# Altium schematic symbol library jlcpcb_2025_04_inductors_extended_0805.schlib: 882 symbols (part 5 of 5)
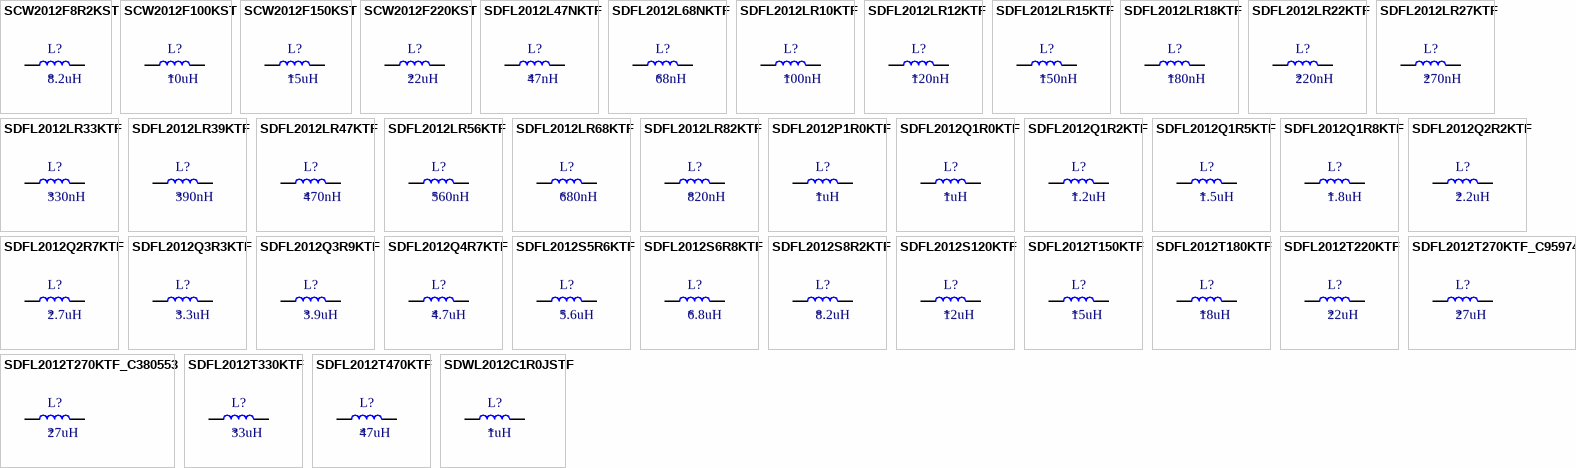
[diagram p26: symbols SCW2012F8R2KST to SDWL2012C1R0JSTF]

## SDFL2012Q2R2KTF
designator L?  Inductance: 2.2uH
Inductor, 2.2uH, ±10%, 650mΩ, 30mA, SMD 0805; Manufacturer: Sunlord; Manufacturer Part Number: SDFL2012Q2R2KTF; Package Size: 0805; JLCPCB Basic Part: No; JLCPCB Part Number: C95973; Supplier 1: LCSC; Category: Inductors; Supplier Part Number 1: C95973; Tolerance: ±10%; Rated Current: 30mA; DC Resistance: 650mΩ; RoHS: Yes; ComponentLink1Description: Datasheet; ComponentLink1URL: https://wmsc.lcsc.com/wmsc/upload/file/pdf/v2/lcsc/2310301641_Sunlord-SDFL2012Q2R2KTF_C95973.pdf; ComponentLink2Description: JLCPCB Part URL; ComponentLink2URL: https://jlcpcb.com/partdetail/C95973; ComponentLink3Description: LCSC Part URL; ComponentLink3URL: https://lcsc.com/product-detail/Inductors-SMD_Sunlord-Sunlord-SDFL2012Q2R2KTF_C95973.html
footprint IND-0805 (0805 (2012M) Inductor)
pins: 1, 2

## SDFL2012Q2R7KTF
designator L?  Inductance: 2.7uH
Inductor, 2.7uH, ±10%, 750mΩ, 30mA, SMD 0805; Manufacturer: Sunlord; Manufacturer Part Number: SDFL2012Q2R7KTF; Package Size: 0805; JLCPCB Basic Part: No; JLCPCB Part Number: C74318; Supplier 1: LCSC; Category: Inductors; Supplier Part Number 1: C74318; Tolerance: ±10%; Rated Current: 30mA; DC Resistance: 750mΩ; RoHS: Yes; ComponentLink1Description: Datasheet; ComponentLink1URL: https://wmsc.lcsc.com/wmsc/upload/file/pdf/v2/lcsc/2310301641_Sunlord-SDFL2012Q2R7KTF_C74318.pdf; ComponentLink2Description: JLCPCB Part URL; ComponentLink2URL: https://jlcpcb.com/partdetail/C74318; ComponentLink3Description: LCSC Part URL; ComponentLink3URL: https://lcsc.com/product-detail/Inductors-SMD_Sunlord-Sunlord-SDFL2012Q2R7KTF_C74318.html
footprint IND-0805 (0805 (2012M) Inductor)
pins: 1, 2

## SDFL2012Q3R3KTF
designator L?  Inductance: 3.3uH
Inductor, 3.3uH, ±10%, 800mΩ, 30mA, SMD 0805; Manufacturer: Sunlord; Manufacturer Part Number: SDFL2012Q3R3KTF; Package Size: 0805; JLCPCB Basic Part: No; JLCPCB Part Number: C51725; Supplier 1: LCSC; Category: Inductors; Supplier Part Number 1: C51725; Tolerance: ±10%; Rated Current: 30mA; DC Resistance: 800mΩ; RoHS: Yes; ComponentLink1Description: Datasheet; ComponentLink1URL: https://wmsc.lcsc.com/wmsc/upload/file/pdf/v2/lcsc/2310301641_Sunlord-SDFL2012Q3R3KTF_C51725.pdf; ComponentLink2Description: JLCPCB Part URL; ComponentLink2URL: https://jlcpcb.com/partdetail/C51725; ComponentLink3Description: LCSC Part URL; ComponentLink3URL: https://lcsc.com/product-detail/Inductors-SMD_Sunlord-Sunlord-SDFL2012Q3R3KTF_C51725.html
footprint IND-0805 (0805 (2012M) Inductor)
pins: 1, 2

## SDFL2012Q3R9KTF
designator L?  Inductance: 3.9uH
Inductor, 3.9uH, ±10%, 900mΩ, 30mA, SMD 0805; Manufacturer: Sunlord; Manufacturer Part Number: SDFL2012Q3R9KTF; Package Size: 0805; JLCPCB Basic Part: No; JLCPCB Part Number: C370274; Supplier 1: LCSC; Category: Inductors; Supplier Part Number 1: C370274; Tolerance: ±10%; Rated Current: 30mA; DC Resistance: 900mΩ; RoHS: Yes; ComponentLink1Description: Datasheet; ComponentLink1URL: https://wmsc.lcsc.com/wmsc/upload/file/pdf/v2/lcsc/2310301641_Sunlord-SDFL2012Q3R9KTF_C370274.pdf; ComponentLink2Description: JLCPCB Part URL; ComponentLink2URL: https://jlcpcb.com/partdetail/C370274; ComponentLink3Description: LCSC Part URL; ComponentLink3URL: https://lcsc.com/product-detail/Inductors-SMD_Sunlord-Sunlord-SDFL2012Q3R9KTF_C370274.html
footprint IND-0805 (0805 (2012M) Inductor)
pins: 1, 2

## SDFL2012Q4R7KTF
designator L?  Inductance: 4.7uH
Inductor, 4.7uH, ±10%, 1Ω, 30mA, SMD 0805; Manufacturer: Sunlord; Manufacturer Part Number: SDFL2012Q4R7KTF; Package Size: 0805; JLCPCB Basic Part: No; JLCPCB Part Number: C74314; Supplier 1: LCSC; Category: Inductors; Supplier Part Number 1: C74314; Tolerance: ±10%; Rated Current: 30mA; DC Resistance: 1Ω; RoHS: Yes; ComponentLink1Description: Datasheet; ComponentLink1URL: https://wmsc.lcsc.com/wmsc/upload/file/pdf/v2/lcsc/2310301641_Sunlord-SDFL2012Q4R7KTF_C74314.pdf; ComponentLink2Description: JLCPCB Part URL; ComponentLink2URL: https://jlcpcb.com/partdetail/C74314; ComponentLink3Description: LCSC Part URL; ComponentLink3URL: https://lcsc.com/product-detail/Inductors-SMD_Sunlord-Sunlord-SDFL2012Q4R7KTF_C74314.html
footprint IND-0805 (0805 (2012M) Inductor)
pins: 1, 2

## SDFL2012S5R6KTF
designator L?  Inductance: 5.6uH
Inductor, 5.6uH, ±10%, 900mΩ, 15mA, SMD 0805; Manufacturer: Sunlord; Manufacturer Part Number: SDFL2012S5R6KTF; Package Size: 0805; JLCPCB Basic Part: No; JLCPCB Part Number: C185875; Supplier 1: LCSC; Category: Inductors; Supplier Part Number 1: C185875; Tolerance: ±10%; Rated Current: 15mA; DC Resistance: 900mΩ; RoHS: Yes; ComponentLink1Description: Datasheet; ComponentLink1URL: https://wmsc.lcsc.com/wmsc/upload/file/pdf/v2/lcsc/2310301641_Sunlord-SDFL2012S5R6KTF_C185875.pdf; ComponentLink2Description: JLCPCB Part URL; ComponentLink2URL: https://jlcpcb.com/partdetail/C185875; ComponentLink3Description: LCSC Part URL; ComponentLink3URL: https://lcsc.com/product-detail/Inductors-SMD_Sunlord-Sunlord-SDFL2012S5R6KTF_C185875.html
footprint IND-0805 (0805 (2012M) Inductor)
pins: 1, 2

## SDFL2012S6R8KTF
designator L?  Inductance: 6.8uH
Inductor, 6.8uH, ±10%, 1Ω, 15mA, SMD 0805; Manufacturer: Sunlord; Manufacturer Part Number: SDFL2012S6R8KTF; Package Size: 0805; JLCPCB Basic Part: No; JLCPCB Part Number: C334249; Supplier 1: LCSC; Category: Inductors; Supplier Part Number 1: C334249; Tolerance: ±10%; Rated Current: 15mA; DC Resistance: 1Ω; RoHS: Yes; ComponentLink1Description: Datasheet; ComponentLink1URL: https://wmsc.lcsc.com/wmsc/upload/file/pdf/v2/lcsc/2310301641_Sunlord-SDFL2012S6R8KTF_C334249.pdf; ComponentLink2Description: JLCPCB Part URL; ComponentLink2URL: https://jlcpcb.com/partdetail/C334249; ComponentLink3Description: LCSC Part URL; ComponentLink3URL: https://lcsc.com/product-detail/Inductors-SMD_Sunlord-Sunlord-SDFL2012S6R8KTF_C334249.html
footprint IND-0805 (0805 (2012M) Inductor)
pins: 1, 2

## SDFL2012S8R2KTF
designator L?  Inductance: 8.2uH
Inductor, 8.2uH, ±10%, 1.1Ω, 15mA, SMD 0805; Manufacturer: Sunlord; Manufacturer Part Number: SDFL2012S8R2KTF; Package Size: 0805; JLCPCB Basic Part: No; JLCPCB Part Number: C334248; Supplier 1: LCSC; Category: Inductors; Supplier Part Number 1: C334248; Tolerance: ±10%; Rated Current: 15mA; DC Resistance: 1.1Ω; RoHS: Yes; ComponentLink1Description: Datasheet; ComponentLink1URL: https://wmsc.lcsc.com/wmsc/upload/file/pdf/v2/lcsc/2310301641_Sunlord-SDFL2012S8R2KTF_C334248.pdf; ComponentLink2Description: JLCPCB Part URL; ComponentLink2URL: https://jlcpcb.com/partdetail/C334248; ComponentLink3Description: LCSC Part URL; ComponentLink3URL: https://lcsc.com/product-detail/Inductors-SMD_Sunlord-Sunlord-SDFL2012S8R2KTF_C334248.html
footprint IND-0805 (0805 (2012M) Inductor)
pins: 1, 2

## SDFL2012S120KTF
designator L?  Inductance: 12uH
Inductor, 12uH, ±10%, 1.25Ω, 15mA, SMD 0805; Manufacturer: Sunlord; Manufacturer Part Number: SDFL2012S120KTF; Package Size: 0805; JLCPCB Basic Part: No; JLCPCB Part Number: C370275; Supplier 1: LCSC; Category: Inductors; Supplier Part Number 1: C370275; Tolerance: ±10%; Rated Current: 15mA; DC Resistance: 1.25Ω; RoHS: Yes; ComponentLink1Description: Datasheet; ComponentLink1URL: https://wmsc.lcsc.com/wmsc/upload/file/pdf/v2/lcsc/2310301641_Sunlord-SDFL2012S120KTF_C370275.pdf; ComponentLink2Description: JLCPCB Part URL; ComponentLink2URL: https://jlcpcb.com/partdetail/C370275; ComponentLink3Description: LCSC Part URL; ComponentLink3URL: https://lcsc.com/product-detail/Inductors-SMD_Sunlord-Sunlord-SDFL2012S120KTF_C370275.html
footprint IND-0805 (0805 (2012M) Inductor)
pins: 1, 2

## SDFL2012T150KTF
designator L?  Inductance: 15uH
Inductor, 15uH, ±10%, 800mΩ, 5mA, SMD 0805; Manufacturer: Sunlord; Manufacturer Part Number: SDFL2012T150KTF; Package Size: 0805; JLCPCB Basic Part: No; JLCPCB Part Number: C154120; Supplier 1: LCSC; Category: Inductors; Supplier Part Number 1: C154120; Tolerance: ±10%; Rated Current: 5mA; DC Resistance: 800mΩ; RoHS: Yes; ComponentLink1Description: Datasheet; ComponentLink1URL: https://wmsc.lcsc.com/wmsc/upload/file/pdf/v2/lcsc/2310301641_Sunlord-SDFL2012T150KTF_C154120.pdf; ComponentLink2Description: JLCPCB Part URL; ComponentLink2URL: https://jlcpcb.com/partdetail/C154120; ComponentLink3Description: LCSC Part URL; ComponentLink3URL: https://lcsc.com/product-detail/Inductors-SMD_Sunlord-Sunlord-SDFL2012T150KTF_C154120.html
footprint IND-0805 (0805 (2012M) Inductor)
pins: 1, 2

## SDFL2012T180KTF
designator L?  Inductance: 18uH
Inductor, 18uH, ±10%, 900mΩ, 5mA, SMD 0805; Manufacturer: Sunlord; Manufacturer Part Number: SDFL2012T180KTF; Package Size: 0805; JLCPCB Basic Part: No; JLCPCB Part Number: C185900; Supplier 1: LCSC; Category: Inductors; Supplier Part Number 1: C185900; Tolerance: ±10%; Rated Current: 5mA; DC Resistance: 900mΩ; RoHS: Yes; ComponentLink1Description: Datasheet; ComponentLink1URL: https://wmsc.lcsc.com/wmsc/upload/file/pdf/v2/lcsc/2310301641_Sunlord-SDFL2012T180KTF_C185900.pdf; ComponentLink2Description: JLCPCB Part URL; ComponentLink2URL: https://jlcpcb.com/partdetail/C185900; ComponentLink3Description: LCSC Part URL; ComponentLink3URL: https://lcsc.com/product-detail/Inductors-SMD_Sunlord-Sunlord-SDFL2012T180KTF_C185900.html
footprint IND-0805 (0805 (2012M) Inductor)
pins: 1, 2

## SDFL2012T220KTF
designator L?  Inductance: 22uH
Inductor, 22uH, ±10%, 1.1Ω, 5mA, SMD 0805; Manufacturer: Sunlord; Manufacturer Part Number: SDFL2012T220KTF; Package Size: 0805; JLCPCB Basic Part: No; JLCPCB Part Number: C32375; Supplier 1: LCSC; Category: Inductors; Supplier Part Number 1: C32375; Tolerance: ±10%; Rated Current: 5mA; DC Resistance: 1.1Ω; RoHS: Yes; ComponentLink1Description: Datasheet; ComponentLink1URL: https://wmsc.lcsc.com/wmsc/upload/file/pdf/v2/lcsc/2310301641_Sunlord-SDFL2012T220KTF_C32375.pdf; ComponentLink2Description: JLCPCB Part URL; ComponentLink2URL: https://jlcpcb.com/partdetail/C32375; ComponentLink3Description: LCSC Part URL; ComponentLink3URL: https://lcsc.com/product-detail/Inductors-SMD_Sunlord-Sunlord-SDFL2012T220KTF_C32375.html
footprint IND-0805 (0805 (2012M) Inductor)
pins: 1, 2

## SDFL2012T270KTF_C95974
designator L?  Inductance: 27uH
Inductor, 27uH, ±10%, 1.15Ω, 5mA, SMD 0805; Manufacturer: Sunlord; Manufacturer Part Number: SDFL2012T270KTF; Package Size: 0805; JLCPCB Basic Part: No; JLCPCB Part Number: C95974; Supplier 1: LCSC; Category: Inductors; Supplier Part Number 1: C95974; Tolerance: ±10%; Rated Current: 5mA; DC Resistance: 1.15Ω; RoHS: Yes; ComponentLink1Description: Datasheet; ComponentLink1URL: https://wmsc.lcsc.com/wmsc/upload/file/pdf/v2/lcsc/2310301641_Sunlord-SDFL2012T270KTF_C95974.pdf; ComponentLink2Description: JLCPCB Part URL; ComponentLink2URL: https://jlcpcb.com/partdetail/C95974; ComponentLink3Description: LCSC Part URL; ComponentLink3URL: https://lcsc.com/product-detail/Inductors-SMD_Sunlord-Sunlord-SDFL2012T270KTF_C95974.html
footprint IND-0805 (0805 (2012M) Inductor)
pins: 1, 2

## SDFL2012T270KTF_C380553
designator L?  Inductance: 27uH
Inductor, 27uH, ±10%, 1.15Ω, 5mA, SMD 0805; Manufacturer: Sunlord; Manufacturer Part Number: SDFL2012T270KTF; Package Size: 0805; JLCPCB Basic Part: No; JLCPCB Part Number: C380553; Supplier 1: LCSC; Category: Inductors; Supplier Part Number 1: C380553; Tolerance: ±10%; Rated Current: 5mA; DC Resistance: 1.15Ω; RoHS: Yes; ComponentLink1Description: Datasheet; ComponentLink1URL: https://wmsc.lcsc.com/wmsc/upload/file/pdf/v2/lcsc/2310301641_Sunlord-SDFL2012T270KTF_C380553.pdf; ComponentLink2Description: JLCPCB Part URL; ComponentLink2URL: https://jlcpcb.com/partdetail/C380553; ComponentLink3Description: LCSC Part URL; ComponentLink3URL: https://lcsc.com/product-detail/Inductors-SMD_Sunlord-Sunlord-SDFL2012T270KTF_C380553.html
footprint IND-0805 (0805 (2012M) Inductor)
pins: 1, 2

## SDFL2012T330KTF
designator L?  Inductance: 33uH
Inductor, 33uH, ±10%, 1.25Ω, 5mA, SMD 0805; Manufacturer: Sunlord; Manufacturer Part Number: SDFL2012T330KTF; Package Size: 0805; JLCPCB Basic Part: No; JLCPCB Part Number: C95975; Supplier 1: LCSC; Category: Inductors; Supplier Part Number 1: C95975; Tolerance: ±10%; Rated Current: 5mA; DC Resistance: 1.25Ω; RoHS: Yes; ComponentLink1Description: Datasheet; ComponentLink1URL: https://wmsc.lcsc.com/wmsc/upload/file/pdf/v2/lcsc/2310301641_Sunlord-SDFL2012T330KTF_C95975.pdf; ComponentLink2Description: JLCPCB Part URL; ComponentLink2URL: https://jlcpcb.com/partdetail/C95975; ComponentLink3Description: LCSC Part URL; ComponentLink3URL: https://lcsc.com/product-detail/Inductors-SMD_Sunlord-Sunlord-SDFL2012T330KTF_C95975.html
footprint IND-0805 (0805 (2012M) Inductor)
pins: 1, 2

## SDFL2012T470KTF
designator L?  Inductance: 47uH
Inductor, 47uH, ±10%, 3Ω, 4mA, SMD 0805; Manufacturer: Sunlord; Manufacturer Part Number: SDFL2012T470KTF; Package Size: 0805; JLCPCB Basic Part: No; JLCPCB Part Number: C14304; Supplier 1: LCSC; Category: Inductors; Supplier Part Number 1: C14304; Tolerance: ±10%; Rated Current: 4mA; DC Resistance: 3Ω; RoHS: Yes; ComponentLink1Description: Datasheet; ComponentLink1URL: https://wmsc.lcsc.com/wmsc/upload/file/pdf/v2/lcsc/2310301641_Sunlord-SDFL2012T470KTF_C14304.pdf; ComponentLink2Description: JLCPCB Part URL; ComponentLink2URL: https://jlcpcb.com/partdetail/C14304; ComponentLink3Description: LCSC Part URL; ComponentLink3URL: https://lcsc.com/product-detail/Inductors-SMD_Sunlord-Sunlord-SDFL2012T470KTF_C14304.html
footprint IND-0805 (0805 (2012M) Inductor)
pins: 1, 2

## SDWL2012C1R0JSTF
designator L?  Inductance: 1uH
Inductor, 1uH, ±5%, 2.5Ω, 150mA, SMD 0805; Manufacturer: Sunlord; Manufacturer Part Number: SDWL2012C1R0JSTF; Package Size: 0805; JLCPCB Basic Part: No; JLCPCB Part Number: C145058; Supplier 1: LCSC; Category: Inductors; Supplier Part Number 1: C145058; Tolerance: ±5%; Rated Current: 150mA; DC Resistance: 2.5Ω; RoHS: Yes; ComponentLink1Description: Datasheet; ComponentLink1URL: https://wmsc.lcsc.com/wmsc/upload/file/pdf/v2/lcsc/2310301641_Sunlord-SDWL2012C1R0JSTF_C145058.pdf; ComponentLink2Description: JLCPCB Part URL; ComponentLink2URL: https://jlcpcb.com/partdetail/C145058; ComponentLink3Description: LCSC Part URL; ComponentLink3URL: https://lcsc.com/product-detail/Inductors-SMD_Sunlord-Sunlord-SDWL2012C1R0JSTF_C145058.html
footprint IND-0805 (0805 (2012M) Inductor)
pins: 1, 2

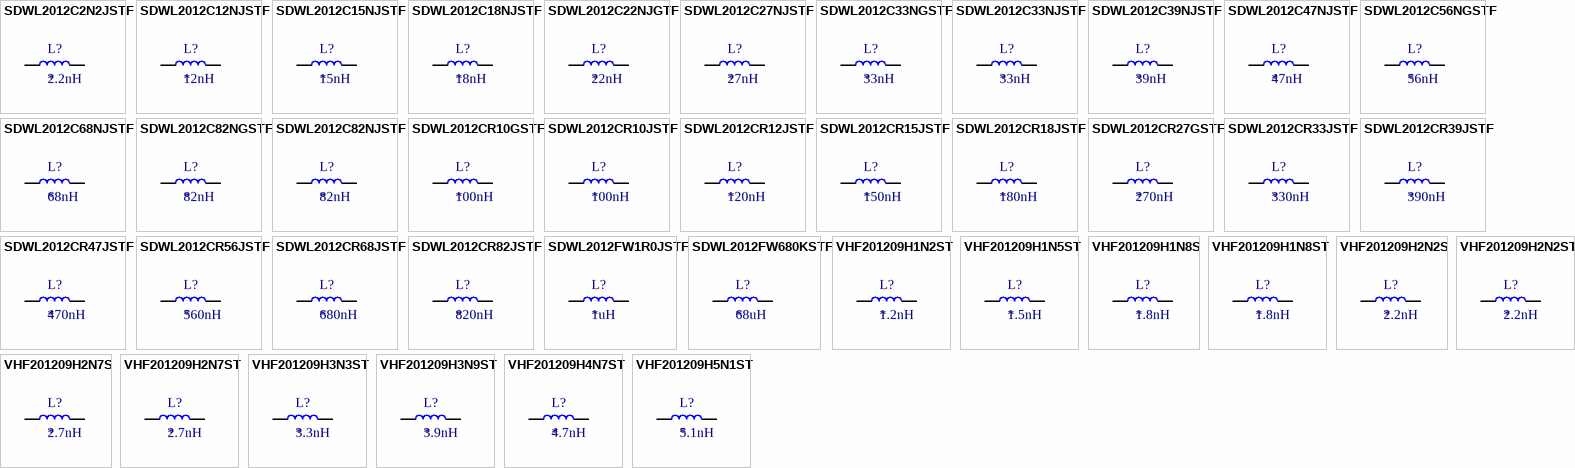
[diagram p20: symbols SDWL2012C2N2JSTF to VHF201209H5N1ST]

## SDWL2012C2N2JSTF
designator L?  Inductance: 2.2nH
Inductor, 2.2nH, ±5%, 100mΩ, 600mA, SMD 0805; Manufacturer: Sunlord; Manufacturer Part Number: SDWL2012C2N2JSTF; Package Size: 0805; JLCPCB Basic Part: No; JLCPCB Part Number: C70962; Supplier 1: LCSC; Category: Inductors; Supplier Part Number 1: C70962; Tolerance: ±5%; Rated Current: 600mA; DC Resistance: 100mΩ; RoHS: Yes; ComponentLink1Description: Datasheet; ComponentLink1URL: https://wmsc.lcsc.com/wmsc/upload/file/pdf/v2/lcsc/2310301641_Sunlord-SDWL2012C2N2JSTF_C70962.pdf; ComponentLink2Description: JLCPCB Part URL; ComponentLink2URL: https://jlcpcb.com/partdetail/C70962; ComponentLink3Description: LCSC Part URL; ComponentLink3URL: https://lcsc.com/product-detail/Inductors-SMD_Sunlord-Sunlord-SDWL2012C2N2JSTF_C70962.html
footprint IND-0805 (0805 (2012M) Inductor)
pins: 1, 2

## SDWL2012C12NJSTF
designator L?  Inductance: 12nH
Inductor, 12nH, ±5%, 150mΩ, 600mA, SMD 0805; Manufacturer: Sunlord; Manufacturer Part Number: SDWL2012C12NJSTF; Package Size: 0805; JLCPCB Basic Part: No; JLCPCB Part Number: C370376; Supplier 1: LCSC; Category: Inductors; Supplier Part Number 1: C370376; Tolerance: ±5%; Rated Current: 600mA; DC Resistance: 150mΩ; RoHS: Yes; ComponentLink1Description: Datasheet; ComponentLink1URL: https://wmsc.lcsc.com/wmsc/upload/file/pdf/v2/lcsc/2310271749_Sunlord-SDWL2012C12NJSTF_C370376.pdf; ComponentLink2Description: JLCPCB Part URL; ComponentLink2URL: https://jlcpcb.com/partdetail/C370376; ComponentLink3Description: LCSC Part URL; ComponentLink3URL: https://lcsc.com/product-detail/Inductors-SMD_Sunlord-Sunlord-SDWL2012C12NJSTF_C370376.html
footprint IND-0805 (0805 (2012M) Inductor)
pins: 1, 2

## SDWL2012C15NJSTF
designator L?  Inductance: 15nH
Inductor, 15nH, ±5%, 170mΩ, 600mA, SMD 0805; Manufacturer: Sunlord; Manufacturer Part Number: SDWL2012C15NJSTF; Package Size: 0805; JLCPCB Basic Part: No; JLCPCB Part Number: C145054; Supplier 1: LCSC; Category: Inductors; Supplier Part Number 1: C145054; Tolerance: ±5%; Rated Current: 600mA; DC Resistance: 170mΩ; RoHS: Yes; ComponentLink1Description: Datasheet; ComponentLink1URL: https://wmsc.lcsc.com/wmsc/upload/file/pdf/v2/lcsc/2310301641_Sunlord-SDWL2012C15NJSTF_C145054.pdf; ComponentLink2Description: JLCPCB Part URL; ComponentLink2URL: https://jlcpcb.com/partdetail/C145054; ComponentLink3Description: LCSC Part URL; ComponentLink3URL: https://lcsc.com/product-detail/Inductors-SMD_Sunlord-Sunlord-SDWL2012C15NJSTF_C145054.html
footprint IND-0805 (0805 (2012M) Inductor)
pins: 1, 2

## SDWL2012C18NJSTF
designator L?  Inductance: 18nH
Inductor, 18nH, ±5%, 200mΩ, 600mA, SMD 0805; Manufacturer: Sunlord; Manufacturer Part Number: SDWL2012C18NJSTF; Package Size: 0805; JLCPCB Basic Part: No; JLCPCB Part Number: C370377; Supplier 1: LCSC; Category: Inductors; Supplier Part Number 1: C370377; Tolerance: ±5%; Rated Current: 600mA; DC Resistance: 200mΩ; RoHS: Yes; ComponentLink1Description: Datasheet; ComponentLink1URL: https://wmsc.lcsc.com/wmsc/upload/file/pdf/v2/lcsc/2310301641_Sunlord-SDWL2012C18NJSTF_C370377.pdf; ComponentLink2Description: JLCPCB Part URL; ComponentLink2URL: https://jlcpcb.com/partdetail/C370377; ComponentLink3Description: LCSC Part URL; ComponentLink3URL: https://lcsc.com/product-detail/Inductors-SMD_Sunlord-Sunlord-SDWL2012C18NJSTF_C370377.html
footprint IND-0805 (0805 (2012M) Inductor)
pins: 1, 2

## SDWL2012C22NJGTF
designator L?  Inductance: 22nH
Inductor, 22nH, ±5%, 220mΩ, 500mA, SMD 0805; Manufacturer: Sunlord; Manufacturer Part Number: SDWL2012C22NJGTF; Package Size: 0805; JLCPCB Basic Part: No; JLCPCB Part Number: C279931; Supplier 1: LCSC; Category: Inductors; Supplier Part Number 1: C279931; Tolerance: ±5%; Rated Current: 500mA; DC Resistance: 220mΩ; RoHS: Yes; ComponentLink1Description: Datasheet; ComponentLink1URL: https://wmsc.lcsc.com/wmsc/upload/file/pdf/v2/lcsc/2310301641_Sunlord-SDWL2012C22NJGTF_C279931.pdf; ComponentLink2Description: JLCPCB Part URL; ComponentLink2URL: https://jlcpcb.com/partdetail/C279931; ComponentLink3Description: LCSC Part URL; ComponentLink3URL: https://lcsc.com/product-detail/Inductors-SMD_Sunlord-Sunlord-SDWL2012C22NJGTF_C279931.html
footprint IND-0805 (0805 (2012M) Inductor)
pins: 1, 2

## SDWL2012C27NJSTF
designator L?  Inductance: 27nH
Inductor, 27nH, ±5%, 250mΩ, 500mA, SMD 0805; Manufacturer: Sunlord; Manufacturer Part Number: SDWL2012C27NJSTF; Package Size: 0805; JLCPCB Basic Part: No; JLCPCB Part Number: C361615; Supplier 1: LCSC; Category: Inductors; Supplier Part Number 1: C361615; Tolerance: ±5%; Rated Current: 500mA; DC Resistance: 250mΩ; RoHS: Yes; ComponentLink1Description: Datasheet; ComponentLink1URL: https://wmsc.lcsc.com/wmsc/upload/file/pdf/v2/lcsc/2310301641_Sunlord-SDWL2012C27NJSTF_C361615.pdf; ComponentLink2Description: JLCPCB Part URL; ComponentLink2URL: https://jlcpcb.com/partdetail/C361615; ComponentLink3Description: LCSC Part URL; ComponentLink3URL: https://lcsc.com/product-detail/Inductors-SMD_Sunlord-Sunlord-SDWL2012C27NJSTF_C361615.html
footprint IND-0805 (0805 (2012M) Inductor)
pins: 1, 2

## SDWL2012C33NGSTF
designator L?  Inductance: 33nH
Inductor, 33nH, ±2%, 270mΩ, 500mA, SMD 0805; Manufacturer: Sunlord; Manufacturer Part Number: SDWL2012C33NGSTF; Package Size: 0805; JLCPCB Basic Part: No; JLCPCB Part Number: C370380; Supplier 1: LCSC; Category: Inductors; Supplier Part Number 1: C370380; Tolerance: ±2%; Rated Current: 500mA; DC Resistance: 270mΩ; RoHS: Yes; ComponentLink1Description: Datasheet; ComponentLink1URL: https://wmsc.lcsc.com/wmsc/upload/file/pdf/v2/lcsc/2110081530_Sunlord-SDWL2012C33NGSTF_C370380.pdf; ComponentLink2Description: JLCPCB Part URL; ComponentLink2URL: https://jlcpcb.com/partdetail/C370380; ComponentLink3Description: LCSC Part URL; ComponentLink3URL: https://lcsc.com/product-detail/Inductors-SMD_Sunlord-Sunlord-SDWL2012C33NGSTF_C370380.html
footprint IND-0805 (0805 (2012M) Inductor)
pins: 1, 2

## SDWL2012C33NJSTF
designator L?  Inductance: 33nH
Inductor, 33nH, ±5%, 270mΩ, 500mA, SMD 0805; Manufacturer: Sunlord; Manufacturer Part Number: SDWL2012C33NJSTF; Package Size: 0805; JLCPCB Basic Part: No; JLCPCB Part Number: C98209; Supplier 1: LCSC; Category: Inductors; Supplier Part Number 1: C98209; Tolerance: ±5%; Rated Current: 500mA; DC Resistance: 270mΩ; RoHS: Yes; ComponentLink1Description: Datasheet; ComponentLink1URL: https://wmsc.lcsc.com/wmsc/upload/file/pdf/v2/lcsc/2310301641_Sunlord-SDWL2012C33NJSTF_C98209.pdf; ComponentLink2Description: JLCPCB Part URL; ComponentLink2URL: https://jlcpcb.com/partdetail/C98209; ComponentLink3Description: LCSC Part URL; ComponentLink3URL: https://lcsc.com/product-detail/Inductors-SMD_Sunlord-Sunlord-SDWL2012C33NJSTF_C98209.html
footprint IND-0805 (0805 (2012M) Inductor)
pins: 1, 2

## SDWL2012C39NJSTF
designator L?  Inductance: 39nH
Inductor, 39nH, ±5%, 290mΩ, 500mA, SMD 0805; Manufacturer: Sunlord; Manufacturer Part Number: SDWL2012C39NJSTF; Package Size: 0805; JLCPCB Basic Part: No; JLCPCB Part Number: C370381; Supplier 1: LCSC; Category: Inductors; Supplier Part Number 1: C370381; Tolerance: ±5%; Rated Current: 500mA; DC Resistance: 290mΩ; RoHS: Yes; ComponentLink1Description: Datasheet; ComponentLink1URL: https://wmsc.lcsc.com/wmsc/upload/file/pdf/v2/lcsc/2310301641_Sunlord-SDWL2012C39NJSTF_C370381.pdf; ComponentLink2Description: JLCPCB Part URL; ComponentLink2URL: https://jlcpcb.com/partdetail/C370381; ComponentLink3Description: LCSC Part URL; ComponentLink3URL: https://lcsc.com/product-detail/Inductors-SMD_Sunlord-Sunlord-SDWL2012C39NJSTF_C370381.html
footprint IND-0805 (0805 (2012M) Inductor)
pins: 1, 2

## SDWL2012C47NJSTF
designator L?  Inductance: 47nH
Inductor, 47nH, ±5%, 310mΩ, 500mA, SMD 0805; Manufacturer: Sunlord; Manufacturer Part Number: SDWL2012C47NJSTF; Package Size: 0805; JLCPCB Basic Part: No; JLCPCB Part Number: C370382; Supplier 1: LCSC; Category: Inductors; Supplier Part Number 1: C370382; Tolerance: ±5%; Rated Current: 500mA; DC Resistance: 310mΩ; RoHS: Yes; ComponentLink1Description: Datasheet; ComponentLink1URL: https://wmsc.lcsc.com/wmsc/upload/file/pdf/v2/lcsc/2310301641_Sunlord-SDWL2012C47NJSTF_C370382.pdf; ComponentLink2Description: JLCPCB Part URL; ComponentLink2URL: https://jlcpcb.com/partdetail/C370382; ComponentLink3Description: LCSC Part URL; ComponentLink3URL: https://lcsc.com/product-detail/Inductors-SMD_Sunlord-Sunlord-SDWL2012C47NJSTF_C370382.html
footprint IND-0805 (0805 (2012M) Inductor)
pins: 1, 2

## SDWL2012C56NGSTF
designator L?  Inductance: 56nH
Inductor, 56nH, ±2%, 320mΩ, 500mA, SMD 0805; Manufacturer: Sunlord; Manufacturer Part Number: SDWL2012C56NGSTF; Package Size: 0805; JLCPCB Basic Part: No; JLCPCB Part Number: C370383; Supplier 1: LCSC; Category: Inductors; Supplier Part Number 1: C370383; Tolerance: ±2%; Rated Current: 500mA; DC Resistance: 320mΩ; RoHS: Yes; ComponentLink1Description: Datasheet; ComponentLink1URL: https://wmsc.lcsc.com/wmsc/upload/file/pdf/v2/lcsc/2110081530_Sunlord-SDWL2012C56NGSTF_C370383.pdf; ComponentLink2Description: JLCPCB Part URL; ComponentLink2URL: https://jlcpcb.com/partdetail/C370383; ComponentLink3Description: LCSC Part URL; ComponentLink3URL: https://lcsc.com/product-detail/Inductors-SMD_Sunlord-Sunlord-SDWL2012C56NGSTF_C370383.html
footprint IND-0805 (0805 (2012M) Inductor)
pins: 1, 2

## SDWL2012C68NJSTF
designator L?  Inductance: 68nH
Inductor, 68nH, ±5%, 380mΩ, 500mA, SMD 0805; Manufacturer: Sunlord; Manufacturer Part Number: SDWL2012C68NJSTF; Package Size: 0805; JLCPCB Basic Part: No; JLCPCB Part Number: C370384; Supplier 1: LCSC; Category: Inductors; Supplier Part Number 1: C370384; Tolerance: ±5%; Rated Current: 500mA; DC Resistance: 380mΩ; RoHS: Yes; ComponentLink1Description: Datasheet; ComponentLink1URL: https://wmsc.lcsc.com/wmsc/upload/file/pdf/v2/lcsc/2310301641_Sunlord-SDWL2012C68NJSTF_C370384.pdf; ComponentLink2Description: JLCPCB Part URL; ComponentLink2URL: https://jlcpcb.com/partdetail/C370384; ComponentLink3Description: LCSC Part URL; ComponentLink3URL: https://lcsc.com/product-detail/Inductors-SMD_Sunlord-Sunlord-SDWL2012C68NJSTF_C370384.html
footprint IND-0805 (0805 (2012M) Inductor)
pins: 1, 2

## SDWL2012C82NGSTF
designator L?  Inductance: 82nH
Inductor, 82nH, ±2%, 420mΩ, 400mA, SMD 0805; Manufacturer: Sunlord; Manufacturer Part Number: SDWL2012C82NGSTF; Package Size: 0805; JLCPCB Basic Part: No; JLCPCB Part Number: C370385; Supplier 1: LCSC; Category: Inductors; Supplier Part Number 1: C370385; Tolerance: ±2%; Rated Current: 400mA; DC Resistance: 420mΩ; RoHS: Yes; ComponentLink1Description: Datasheet; ComponentLink1URL: https://wmsc.lcsc.com/wmsc/upload/file/pdf/v2/lcsc/2110081530_Sunlord-SDWL2012C82NGSTF_C370385.pdf; ComponentLink2Description: JLCPCB Part URL; ComponentLink2URL: https://jlcpcb.com/partdetail/C370385; ComponentLink3Description: LCSC Part URL; ComponentLink3URL: https://lcsc.com/product-detail/Inductors-SMD_Sunlord-Sunlord-SDWL2012C82NGSTF_C370385.html
footprint IND-0805 (0805 (2012M) Inductor)
pins: 1, 2

## SDWL2012C82NJSTF
designator L?  Inductance: 82nH
Inductor, 82nH, ±5%, 420mΩ, 400mA, SMD 0805; Manufacturer: Sunlord; Manufacturer Part Number: SDWL2012C82NJSTF; Package Size: 0805; JLCPCB Basic Part: No; JLCPCB Part Number: C145056; Supplier 1: LCSC; Category: Inductors; Supplier Part Number 1: C145056; Tolerance: ±5%; Rated Current: 400mA; DC Resistance: 420mΩ; RoHS: Yes; ComponentLink1Description: Datasheet; ComponentLink1URL: https://wmsc.lcsc.com/wmsc/upload/file/pdf/v2/lcsc/2310301641_Sunlord-SDWL2012C82NJSTF_C145056.pdf; ComponentLink2Description: JLCPCB Part URL; ComponentLink2URL: https://jlcpcb.com/partdetail/C145056; ComponentLink3Description: LCSC Part URL; ComponentLink3URL: https://lcsc.com/product-detail/Inductors-SMD_Sunlord-Sunlord-SDWL2012C82NJSTF_C145056.html
footprint IND-0805 (0805 (2012M) Inductor)
pins: 1, 2

## SDWL2012CR10GSTF
designator L?  Inductance: 100nH
Inductor, 100nH, ±2%, 460mΩ, 400mA, SMD 0805; Manufacturer: Sunlord; Manufacturer Part Number: SDWL2012CR10GSTF; Package Size: 0805; JLCPCB Basic Part: No; JLCPCB Part Number: C370386; Supplier 1: LCSC; Category: Inductors; Supplier Part Number 1: C370386; Tolerance: ±2%; Rated Current: 400mA; DC Resistance: 460mΩ; RoHS: Yes; ComponentLink1Description: Datasheet; ComponentLink1URL: https://wmsc.lcsc.com/wmsc/upload/file/pdf/v2/lcsc/2110081530_Sunlord-SDWL2012CR10GSTF_C370386.pdf; ComponentLink2Description: JLCPCB Part URL; ComponentLink2URL: https://jlcpcb.com/partdetail/C370386; ComponentLink3Description: LCSC Part URL; ComponentLink3URL: https://lcsc.com/product-detail/Inductors-SMD_Sunlord-Sunlord-SDWL2012CR10GSTF_C370386.html
footprint IND-0805 (0805 (2012M) Inductor)
pins: 1, 2

## SDWL2012CR10JSTF
designator L?  Inductance: 100nH
Inductor, 100nH, ±5%, 480mΩ, 400mA, SMD 0805; Manufacturer: Sunlord; Manufacturer Part Number: SDWL2012CR10JSTF; Package Size: 0805; JLCPCB Basic Part: No; JLCPCB Part Number: C95979; Supplier 1: LCSC; Category: Inductors; Supplier Part Number 1: C95979; Tolerance: ±5%; Rated Current: 400mA; DC Resistance: 480mΩ; RoHS: Yes; ComponentLink1Description: Datasheet; ComponentLink1URL: https://wmsc.lcsc.com/wmsc/upload/file/pdf/v2/lcsc/2310301641_Sunlord-SDWL2012CR10JSTF_C95979.pdf; ComponentLink2Description: JLCPCB Part URL; ComponentLink2URL: https://jlcpcb.com/partdetail/C95979; ComponentLink3Description: LCSC Part URL; ComponentLink3URL: https://lcsc.com/product-detail/Inductors-SMD_Sunlord-Sunlord-SDWL2012CR10JSTF_C95979.html
footprint IND-0805 (0805 (2012M) Inductor)
pins: 1, 2

## SDWL2012CR12JSTF
designator L?  Inductance: 120nH
Inductor, 120nH, ±5%, 510mΩ, 400mA, SMD 0805; Manufacturer: Sunlord; Manufacturer Part Number: SDWL2012CR12JSTF; Package Size: 0805; JLCPCB Basic Part: No; JLCPCB Part Number: C370388; Supplier 1: LCSC; Category: Inductors; Supplier Part Number 1: C370388; Tolerance: ±5%; Rated Current: 400mA; DC Resistance: 510mΩ; RoHS: Yes; ComponentLink1Description: Datasheet; ComponentLink1URL: https://wmsc.lcsc.com/wmsc/upload/file/pdf/v2/lcsc/2310301641_Sunlord-SDWL2012CR12JSTF_C370388.pdf; ComponentLink2Description: JLCPCB Part URL; ComponentLink2URL: https://jlcpcb.com/partdetail/C370388; ComponentLink3Description: LCSC Part URL; ComponentLink3URL: https://lcsc.com/product-detail/Inductors-SMD_Sunlord-Sunlord-SDWL2012CR12JSTF_C370388.html
footprint IND-0805 (0805 (2012M) Inductor)
pins: 1, 2

## SDWL2012CR15JSTF
designator L?  Inductance: 150nH
Inductor, 150nH, ±5%, 560mΩ, 400mA, SMD 0805; Manufacturer: Sunlord; Manufacturer Part Number: SDWL2012CR15JSTF; Package Size: 0805; JLCPCB Basic Part: No; JLCPCB Part Number: C370389; Supplier 1: LCSC; Category: Inductors; Supplier Part Number 1: C370389; Tolerance: ±5%; Rated Current: 400mA; DC Resistance: 560mΩ; RoHS: Yes; ComponentLink1Description: Datasheet; ComponentLink1URL: https://wmsc.lcsc.com/wmsc/upload/file/pdf/v2/lcsc/2310301641_Sunlord-SDWL2012CR15JSTF_C370389.pdf; ComponentLink2Description: JLCPCB Part URL; ComponentLink2URL: https://jlcpcb.com/partdetail/C370389; ComponentLink3Description: LCSC Part URL; ComponentLink3URL: https://lcsc.com/product-detail/Inductors-SMD_Sunlord-Sunlord-SDWL2012CR15JSTF_C370389.html
footprint IND-0805 (0805 (2012M) Inductor)
pins: 1, 2

## SDWL2012CR18JSTF
designator L?  Inductance: 180nH
Inductor, 180nH, ±5%, 640mΩ, 400mA, SMD 0805; Manufacturer: Sunlord; Manufacturer Part Number: SDWL2012CR18JSTF; Package Size: 0805; JLCPCB Basic Part: No; JLCPCB Part Number: C370391; Supplier 1: LCSC; Category: Inductors; Supplier Part Number 1: C370391; Tolerance: ±5%; Rated Current: 400mA; DC Resistance: 640mΩ; RoHS: Yes; ComponentLink1Description: Datasheet; ComponentLink1URL: https://wmsc.lcsc.com/wmsc/upload/file/pdf/v2/lcsc/2310301641_Sunlord-SDWL2012CR18JSTF_C370391.pdf; ComponentLink2Description: JLCPCB Part URL; ComponentLink2URL: https://jlcpcb.com/partdetail/C370391; ComponentLink3Description: LCSC Part URL; ComponentLink3URL: https://lcsc.com/product-detail/Inductors-SMD_Sunlord-Sunlord-SDWL2012CR18JSTF_C370391.html
footprint IND-0805 (0805 (2012M) Inductor)
pins: 1, 2

## SDWL2012CR27GSTF
designator L?  Inductance: 270nH
Inductor, 270nH, ±2%, 1Ω, 350mA, SMD 0805; Manufacturer: Sunlord; Manufacturer Part Number: SDWL2012CR27GSTF; Package Size: 0805; JLCPCB Basic Part: No; JLCPCB Part Number: C370392; Supplier 1: LCSC; Category: Inductors; Supplier Part Number 1: C370392; Tolerance: ±2%; Rated Current: 350mA; DC Resistance: 1Ω; RoHS: Yes; ComponentLink1Description: Datasheet; ComponentLink1URL: https://wmsc.lcsc.com/wmsc/upload/file/pdf/v2/lcsc/2110081530_Sunlord-SDWL2012CR27GSTF_C370392.pdf; ComponentLink2Description: JLCPCB Part URL; ComponentLink2URL: https://jlcpcb.com/partdetail/C370392; ComponentLink3Description: LCSC Part URL; ComponentLink3URL: https://lcsc.com/product-detail/Inductors-SMD_Sunlord-Sunlord-SDWL2012CR27GSTF_C370392.html
footprint IND-0805 (0805 (2012M) Inductor)
pins: 1, 2

## SDWL2012CR33JSTF
designator L?  Inductance: 330nH
Inductor, 330nH, ±5%, 1.4Ω, 310mA, SMD 0805; Manufacturer: Sunlord; Manufacturer Part Number: SDWL2012CR33JSTF; Package Size: 0805; JLCPCB Basic Part: No; JLCPCB Part Number: C98210; Supplier 1: LCSC; Category: Inductors; Supplier Part Number 1: C98210; Tolerance: ±5%; Rated Current: 310mA; DC Resistance: 1.4Ω; RoHS: Yes; ComponentLink1Description: Datasheet; ComponentLink1URL: https://wmsc.lcsc.com/wmsc/upload/file/pdf/v2/lcsc/2310301641_Sunlord-SDWL2012CR33JSTF_C98210.pdf; ComponentLink2Description: JLCPCB Part URL; ComponentLink2URL: https://jlcpcb.com/partdetail/C98210; ComponentLink3Description: LCSC Part URL; ComponentLink3URL: https://lcsc.com/product-detail/Inductors-SMD_Sunlord-Sunlord-SDWL2012CR33JSTF_C98210.html
footprint IND-0805 (0805 (2012M) Inductor)
pins: 1, 2

## SDWL2012CR39JSTF
designator L?  Inductance: 390nH
Inductor, 390nH, ±5%, 1.5Ω, 290mA, SMD 0805; Manufacturer: Sunlord; Manufacturer Part Number: SDWL2012CR39JSTF; Package Size: 0805; JLCPCB Basic Part: No; JLCPCB Part Number: C98211; Supplier 1: LCSC; Category: Inductors; Supplier Part Number 1: C98211; Tolerance: ±5%; Rated Current: 290mA; DC Resistance: 1.5Ω; RoHS: Yes; ComponentLink1Description: Datasheet; ComponentLink1URL: https://wmsc.lcsc.com/wmsc/upload/file/pdf/v2/lcsc/2310301641_Sunlord-SDWL2012CR39JSTF_C98211.pdf; ComponentLink2Description: JLCPCB Part URL; ComponentLink2URL: https://jlcpcb.com/partdetail/C98211; ComponentLink3Description: LCSC Part URL; ComponentLink3URL: https://lcsc.com/product-detail/Inductors-SMD_Sunlord-Sunlord-SDWL2012CR39JSTF_C98211.html
footprint IND-0805 (0805 (2012M) Inductor)
pins: 1, 2

## SDWL2012CR47JSTF
designator L?  Inductance: 470nH
Inductor, 470nH, ±5%, 1.72Ω, 250mA, SMD 0805; Manufacturer: Sunlord; Manufacturer Part Number: SDWL2012CR47JSTF; Package Size: 0805; JLCPCB Basic Part: No; JLCPCB Part Number: C98212; Supplier 1: LCSC; Category: Inductors; Supplier Part Number 1: C98212; Tolerance: ±5%; Rated Current: 250mA; DC Resistance: 1.72Ω; RoHS: Yes; ComponentLink1Description: Datasheet; ComponentLink1URL: https://wmsc.lcsc.com/wmsc/upload/file/pdf/v2/lcsc/2310301641_Sunlord-SDWL2012CR47JSTF_C98212.pdf; ComponentLink2Description: JLCPCB Part URL; ComponentLink2URL: https://jlcpcb.com/partdetail/C98212; ComponentLink3Description: LCSC Part URL; ComponentLink3URL: https://lcsc.com/product-detail/Inductors-SMD_Sunlord-Sunlord-SDWL2012CR47JSTF_C98212.html
footprint IND-0805 (0805 (2012M) Inductor)
pins: 1, 2

## SDWL2012CR56JSTF
designator L?  Inductance: 560nH
Inductor, 560nH, ±5%, 1.9Ω, 230mA, SMD 0805; Manufacturer: Sunlord; Manufacturer Part Number: SDWL2012CR56JSTF; Package Size: 0805; JLCPCB Basic Part: No; JLCPCB Part Number: C279898; Supplier 1: LCSC; Category: Inductors; Supplier Part Number 1: C279898; Tolerance: ±5%; Rated Current: 230mA; DC Resistance: 1.9Ω; RoHS: Yes; ComponentLink1Description: Datasheet; ComponentLink1URL: https://wmsc.lcsc.com/wmsc/upload/file/pdf/v2/lcsc/2310301641_Sunlord-SDWL2012CR56JSTF_C279898.pdf; ComponentLink2Description: JLCPCB Part URL; ComponentLink2URL: https://jlcpcb.com/partdetail/C279898; ComponentLink3Description: LCSC Part URL; ComponentLink3URL: https://lcsc.com/product-detail/Inductors-SMD_Sunlord-Sunlord-SDWL2012CR56JSTF_C279898.html
footprint IND-0805 (0805 (2012M) Inductor)
pins: 1, 2

## SDWL2012CR68JSTF
designator L?  Inductance: 680nH
Inductor, 680nH, ±5%, 2.05Ω, 190mA, SMD 0805; Manufacturer: Sunlord; Manufacturer Part Number: SDWL2012CR68JSTF; Package Size: 0805; JLCPCB Basic Part: No; JLCPCB Part Number: C279930; Supplier 1: LCSC; Category: Inductors; Supplier Part Number 1: C279930; Tolerance: ±5%; Rated Current: 190mA; DC Resistance: 2.05Ω; RoHS: Yes; ComponentLink1Description: Datasheet; ComponentLink1URL: https://wmsc.lcsc.com/wmsc/upload/file/pdf/v2/lcsc/2310301641_Sunlord-SDWL2012CR68JSTF_C279930.pdf; ComponentLink2Description: JLCPCB Part URL; ComponentLink2URL: https://jlcpcb.com/partdetail/C279930; ComponentLink3Description: LCSC Part URL; ComponentLink3URL: https://lcsc.com/product-detail/Inductors-SMD_Sunlord-Sunlord-SDWL2012CR68JSTF_C279930.html
footprint IND-0805 (0805 (2012M) Inductor)
pins: 1, 2

## SDWL2012CR82JSTF
designator L?  Inductance: 820nH
Inductor, 820nH, ±5%, 2.3Ω, 180mA, SMD 0805; Manufacturer: Sunlord; Manufacturer Part Number: SDWL2012CR82JSTF; Package Size: 0805; JLCPCB Basic Part: No; JLCPCB Part Number: C145057; Supplier 1: LCSC; Category: Inductors; Supplier Part Number 1: C145057; Tolerance: ±5%; Rated Current: 180mA; DC Resistance: 2.3Ω; RoHS: Yes; ComponentLink1Description: Datasheet; ComponentLink1URL: https://wmsc.lcsc.com/wmsc/upload/file/pdf/v2/lcsc/2310301641_Sunlord-SDWL2012CR82JSTF_C145057.pdf; ComponentLink2Description: JLCPCB Part URL; ComponentLink2URL: https://jlcpcb.com/partdetail/C145057; ComponentLink3Description: LCSC Part URL; ComponentLink3URL: https://lcsc.com/product-detail/Inductors-SMD_Sunlord-Sunlord-SDWL2012CR82JSTF_C145057.html
footprint IND-0805 (0805 (2012M) Inductor)
pins: 1, 2

## SDWL2012FW1R0JSTF
designator L?  Inductance: 1uH
Inductor, 1uH, ±5%, 1.2Ω, 245mA, SMD 0805; Manufacturer: Sunlord; Manufacturer Part Number: SDWL2012FW1R0JSTF; Package Size: 0805; JLCPCB Basic Part: No; JLCPCB Part Number: C370393; Supplier 1: LCSC; Category: Inductors; Supplier Part Number 1: C370393; Tolerance: ±5%; Rated Current: 245mA; DC Resistance: 1.2Ω; RoHS: Yes; ComponentLink1Description: Datasheet; ComponentLink1URL: https://wmsc.lcsc.com/wmsc/upload/file/pdf/v2/lcsc/2310271740_Sunlord-SDWL2012FW1R0JSTF_C370393.pdf; ComponentLink2Description: JLCPCB Part URL; ComponentLink2URL: https://jlcpcb.com/partdetail/C370393; ComponentLink3Description: LCSC Part URL; ComponentLink3URL: https://lcsc.com/product-detail/Inductors-SMD_Sunlord-Sunlord-SDWL2012FW1R0JSTF_C370393.html
footprint IND-0805 (0805 (2012M) Inductor)
pins: 1, 2

## SDWL2012FW680KSTF
designator L?  Inductance: 68uH
Inductor, 68uH, ±10%, 17.5Ω, 40mA, SMD 0805; Manufacturer: Sunlord; Manufacturer Part Number: SDWL2012FW680KSTF; Package Size: 0805; JLCPCB Basic Part: No; JLCPCB Part Number: C370394; Supplier 1: LCSC; Category: Inductors; Supplier Part Number 1: C370394; Tolerance: ±10%; Rated Current: 40mA; DC Resistance: 17.5Ω; RoHS: Yes; ComponentLink1Description: Datasheet; ComponentLink1URL: https://wmsc.lcsc.com/wmsc/upload/file/pdf/v2/lcsc/2310301641_Sunlord-SDWL2012FW680KSTF_C370394.pdf; ComponentLink2Description: JLCPCB Part URL; ComponentLink2URL: https://jlcpcb.com/partdetail/C370394; ComponentLink3Description: LCSC Part URL; ComponentLink3URL: https://lcsc.com/product-detail/Inductors-SMD_Sunlord-Sunlord-SDWL2012FW680KSTF_C370394.html
footprint IND-0805 (0805 (2012M) Inductor)
pins: 1, 2

## VHF201209H1N2ST
designator L?  Inductance: 1.2nH
Inductor, 1.2nH, SMD 0805; Manufacturer: FH(Guangdong Fenghua Advanced Tech); Manufacturer Part Number: VHF201209H1N2ST; Package Size: 0805; JLCPCB Basic Part: No; JLCPCB Part Number: C395097; Supplier 1: LCSC; Category: Inductors; Supplier Part Number 1: C395097; RoHS: Yes; ComponentLink1Description: Datasheet; ComponentLink1URL: https://wmsc.lcsc.com/wmsc/upload/file/pdf/v2/lcsc/2302231208_FH--Guangdong-Fenghua-Advanced-Tech-VHF201209H1N2ST_C395097.pdf; ComponentLink2Description: JLCPCB Part URL; ComponentLink2URL: https://jlcpcb.com/partdetail/C395097; ComponentLink3Description: LCSC Part URL; ComponentLink3URL: https://lcsc.com/product-detail/Inductors-SMD_FH-Guangdong-Fenghua-Advanced-Tech-FH-Guangdong-Fenghua-Advanced-Tech-VHF201209H1N2ST_C395097.html
footprint IND-0805 (0805 (2012M) Inductor)
pins: 1, 2

## VHF201209H1N5ST
designator L?  Inductance: 1.5nH
Inductor, 1.5nH, 100mΩ, 600mA, SMD 0805; Manufacturer: FH(Guangdong Fenghua Advanced Tech); Manufacturer Part Number: VHF201209H1N5ST; Package Size: 0805; JLCPCB Basic Part: No; JLCPCB Part Number: C381903; Supplier 1: LCSC; Category: Inductors; Supplier Part Number 1: C381903; Rated Current: 600mA; DC Resistance: 100mΩ; RoHS: Yes; ComponentLink1Description: Datasheet; ComponentLink1URL: https://wmsc.lcsc.com/wmsc/upload/file/pdf/v2/lcsc/2302231208_FH--Guangdong-Fenghua-Advanced-Tech-VHF201209H1N5ST_C381903.pdf; ComponentLink2Description: JLCPCB Part URL; ComponentLink2URL: https://jlcpcb.com/partdetail/C381903; ComponentLink3Description: LCSC Part URL; ComponentLink3URL: https://lcsc.com/product-detail/Inductors-SMD_FH-Guangdong-Fenghua-Advanced-Tech-FH-Guangdong-Fenghua-Advanced-Tech-VHF201209H1N5ST_C381903.html
footprint IND-0805 (0805 (2012M) Inductor)
pins: 1, 2

## VHF201209H1N8S
designator L?  Inductance: 1.8nH
Inductor, 1.8nH, 100mΩ, 600mA, SMD 0805; Manufacturer: FH(Guangdong Fenghua Advanced Tech); Manufacturer Part Number: VHF201209H1N8S; Package Size: 0805; JLCPCB Basic Part: No; JLCPCB Part Number: C98979; Supplier 1: LCSC; Category: Inductors; Supplier Part Number 1: C98979; Rated Current: 600mA; DC Resistance: 100mΩ; RoHS: Yes; ComponentLink1Description: Datasheet; ComponentLink1URL: https://wmsc.lcsc.com/wmsc/upload/file/pdf/v2/lcsc/2304140030_FH--Guangdong-Fenghua-Advanced-Tech-VHF201209H1N8S_C98979.pdf; ComponentLink2Description: JLCPCB Part URL; ComponentLink2URL: https://jlcpcb.com/partdetail/C98979; ComponentLink3Description: LCSC Part URL; ComponentLink3URL: https://lcsc.com/product-detail/Inductors-SMD_FH-Guangdong-Fenghua-Advanced-Tech-FH-Guangdong-Fenghua-Advanced-Tech-VHF201209H1N8S_C98979.html
footprint IND-0805 (0805 (2012M) Inductor)
pins: 1, 2

## VHF201209H1N8ST
designator L?  Inductance: 1.8nH
Inductor, 1.8nH, 100mΩ, 600mA, SMD 0805; Manufacturer: FH(Guangdong Fenghua Advanced Tech); Manufacturer Part Number: VHF201209H1N8ST; Package Size: 0805; JLCPCB Basic Part: No; JLCPCB Part Number: C1036; Supplier 1: LCSC; Category: Inductors; Supplier Part Number 1: C1036; Rated Current: 600mA; DC Resistance: 100mΩ; RoHS: Yes; ComponentLink1Description: Datasheet; ComponentLink1URL: https://wmsc.lcsc.com/wmsc/upload/file/pdf/v2/lcsc/2302231101_FH--Guangdong-Fenghua-Advanced-Tech-VHF201209H1N8ST_C1036.pdf; ComponentLink2Description: JLCPCB Part URL; ComponentLink2URL: https://jlcpcb.com/partdetail/C1036; ComponentLink3Description: LCSC Part URL; ComponentLink3URL: https://lcsc.com/product-detail/Inductors-SMD_FH-Guangdong-Fenghua-Advanced-Tech-FH-Guangdong-Fenghua-Advanced-Tech-VHF201209H1N8ST_C1036.html
footprint IND-0805 (0805 (2012M) Inductor)
pins: 1, 2

## VHF201209H2N2S
designator L?  Inductance: 2.2nH
Inductor, 2.2nH, 100mΩ, 600mA, SMD 0805; Manufacturer: FH(Guangdong Fenghua Advanced Tech); Manufacturer Part Number: VHF201209H2N2S; Package Size: 0805; JLCPCB Basic Part: No; JLCPCB Part Number: C98980; Supplier 1: LCSC; Category: Inductors; Supplier Part Number 1: C98980; Rated Current: 600mA; DC Resistance: 100mΩ; RoHS: Yes; ComponentLink1Description: Datasheet; ComponentLink1URL: https://wmsc.lcsc.com/wmsc/upload/file/pdf/v2/lcsc/2304140030_FH--Guangdong-Fenghua-Advanced-Tech-VHF201209H2N2S_C98980.pdf; ComponentLink2Description: JLCPCB Part URL; ComponentLink2URL: https://jlcpcb.com/partdetail/C98980; ComponentLink3Description: LCSC Part URL; ComponentLink3URL: https://lcsc.com/product-detail/Inductors-SMD_FH-Guangdong-Fenghua-Advanced-Tech-FH-Guangdong-Fenghua-Advanced-Tech-VHF201209H2N2S_C98980.html
footprint IND-0805 (0805 (2012M) Inductor)
pins: 1, 2
